# Altium footprint library mastermind.PCBLIB: 1061 footprints (part 5 of 67)
Each footprint in its own frame and in the unit in brackets; x right, y up, seen from the top. Pads: shape width x height; smd on the part's side, far side on the other; paste and mask are expansions set on the pad; w line width, h text height; cw(c..) or ccw(c..) is an arc to the next point about the centre after c.
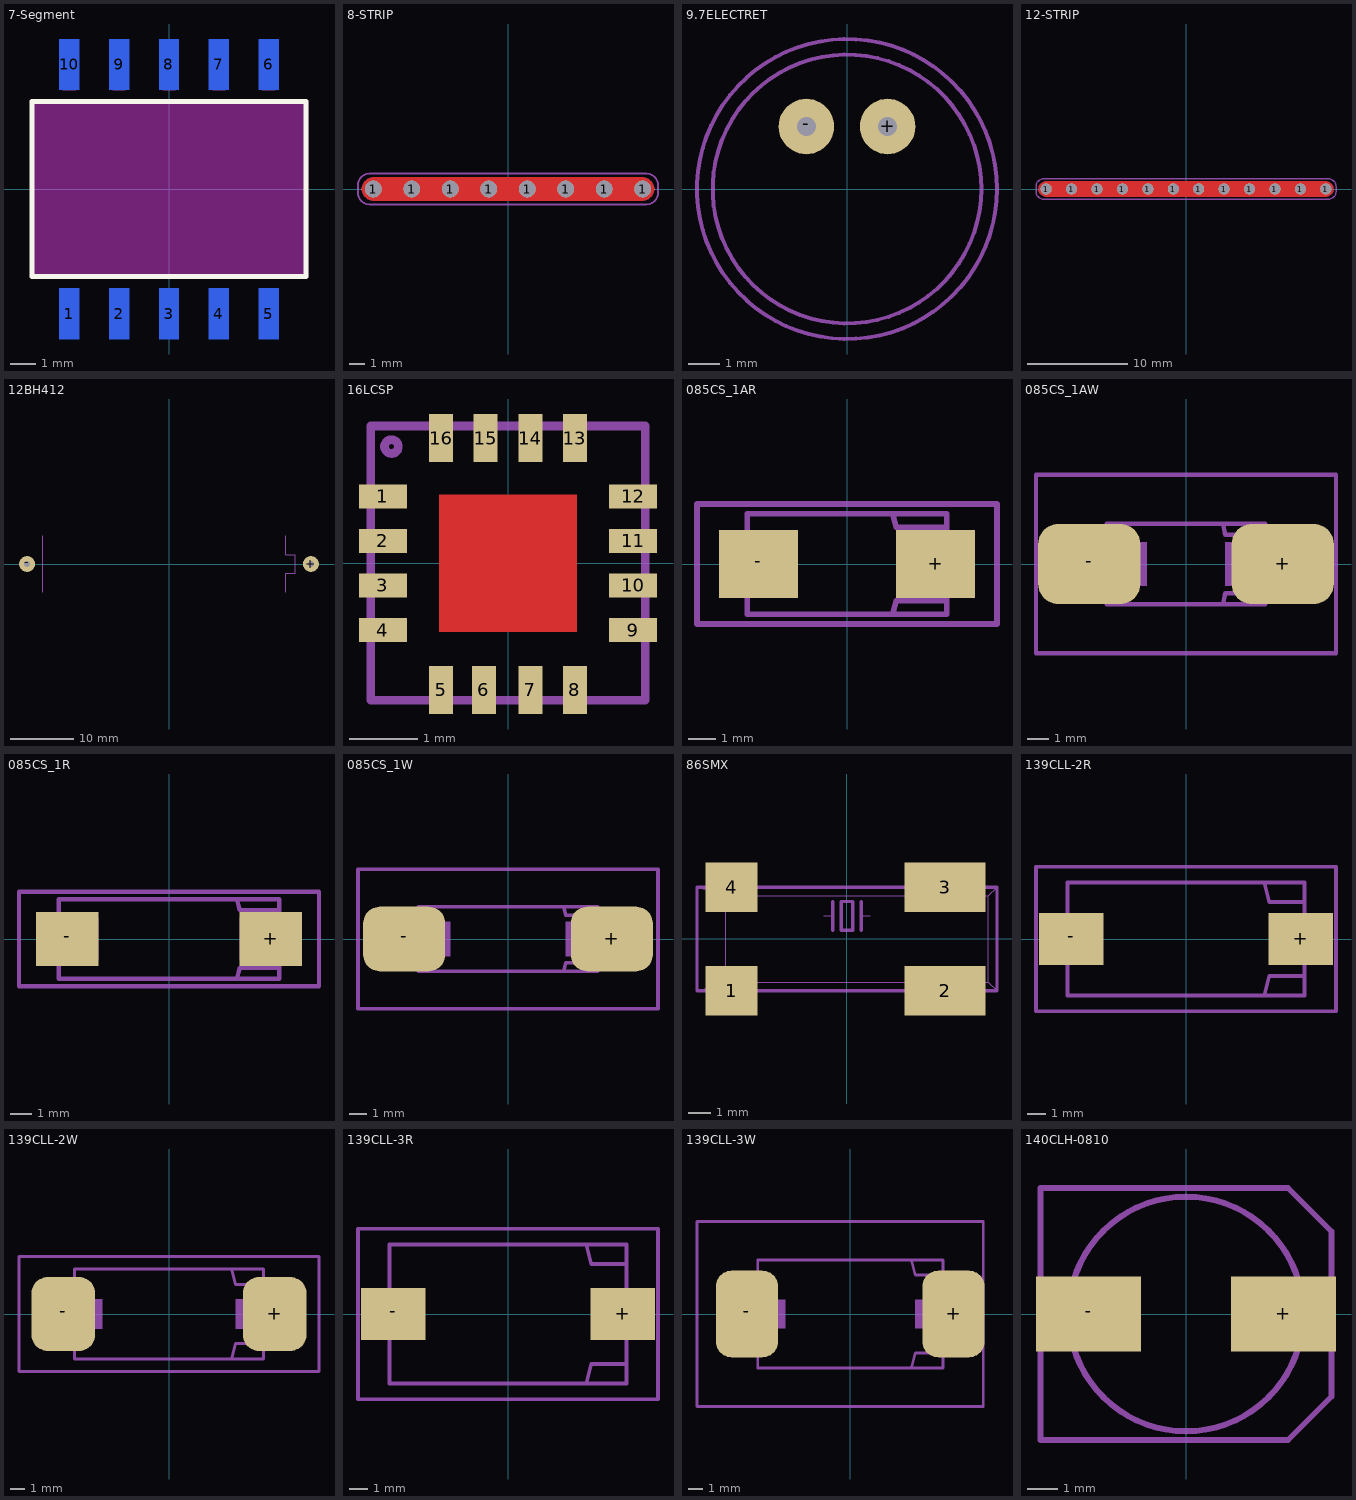
[diagram p4: the footprints below, top view; thin cyan lines are the x and y axes]

## 7-Segment [mm]
pads (10):
  rect 0.8x2.032 smd far side: 1(-4,-5) 2(-2,-5) 3(0,-5) 4(2,-5) 5(4,-5) 6(4,5) 7(2,5) 8(0,5) 9(-2,5) 10(-4,5)
Top Overlay:
  lines w0.2: -5.5,-3.5 5.5,-3.5 5.5,3.5 -5.5,3.5 -5.5,-3.5
Keep-Out Layer:
  region: -5.5,3.5 -5.5,-3.5 5.5,-3.5 5.5,3.5
  lines w0.2: -5.5,-3.5 5.5,-3.5 5.5,3.5 -5.5,3.5
Mechanical 8:
  region: -4.254,3.957 -4.254,5.1 -3.746,5.1 -3.746,3.957
  region: -2.254,3.957 -2.254,5.1 -1.746,5.1 -1.746,3.957
  region: 3.746,-5.127 3.746,-3.984 4.254,-3.984 4.254,-5.127
  region: -4.254,-5.127 -4.254,-3.984 -3.746,-3.984 -3.746,-5.127
  region: -2.254,-5.127 -2.254,-3.984 -1.746,-3.984 -1.746,-5.127
  region: 1.746,-5.127 1.746,-3.984 2.254,-3.984 2.254,-5.127
  region: -0.33,-5.129 -0.33,-3.986 0.178,-3.986 0.178,-5.129
  region: 3.746,3.957 3.746,5.1 4.254,5.1 4.254,3.957
  region: 1.746,3.957 1.746,5.1 2.254,5.1 2.254,3.957
  region: -0.254,3.957 -0.254,5.1 0.254,5.1 0.254,3.957

## 8-STRIP [mm]
pads (8):
  round 1.1 hole 1.1: 1(-8.89,0) 1(-6.35,0) 1(-3.81,0) 1(-1.27,0) 1(1.27,0) 1(3.81,0) 1(6.35,0) 1(8.89,0)
Top Layer:
  region: -9.652,0 -9.652,0.075 -9.623,0.222 -9.565,0.361 -9.482,0.486 -9.376,0.592 -9.251,0.675 -9.112,0.733 -8.965,0.762 -8.89,0.762 8.89,0.762 8.965,0.762 9.112,0.733 9.251,0.675 9.376,0.592 9.482,0.486 9.565,0.361 9.623,0.222 9.652,0.075 9.652,0 9.652,-0.075 9.623,-0.222 9.565,-0.361 9.482,-0.486 9.376,-0.592 9.251,-0.675 9.112,-0.733 8.965,-0.762 8.89,-0.762 -8.89,-0.762 -8.965,-0.762 -9.112,-0.733 -9.251,-0.675 -9.376,-0.592 -9.482,-0.486 -9.565,-0.361 -9.623,-0.222 -9.652,-0.075
Bottom Layer:
  region: 9.652,0 9.652,0.075 9.623,0.222 9.565,0.361 9.482,0.486 9.376,0.592 9.251,0.675 9.112,0.733 8.965,0.762 8.89,0.762 -8.89,0.762 -8.965,0.762 -9.112,0.733 -9.251,0.675 -9.376,0.592 -9.482,0.486 -9.565,0.361 -9.623,0.222 -9.652,0.075 -9.652,0 -9.652,-0.075 -9.623,-0.222 -9.565,-0.361 -9.482,-0.486 -9.376,-0.592 -9.251,-0.675 -9.112,-0.733 -8.965,-0.762 -8.89,-0.762 8.89,-0.762 8.965,-0.762 9.112,-0.733 9.251,-0.675 9.376,-0.592 9.482,-0.486 9.565,-0.361 9.623,-0.222 9.652,-0.075
Top Solder:
  region: -9.779,-0.127 -9.779,-0.202 -9.75,-0.349 -9.692,-0.488 -9.609,-0.613 -9.503,-0.719 -9.378,-0.802 -9.239,-0.86 -9.092,-0.889 -9.017,-0.889 9.017,-0.889 9.092,-0.889 9.239,-0.86 9.378,-0.802 9.503,-0.719 9.609,-0.613 9.692,-0.488 9.75,-0.349 9.779,-0.202 9.779,-0.127 9.779,0.127 9.779,0.202 9.75,0.349 9.692,0.488 9.609,0.613 9.503,0.719 9.378,0.802 9.239,0.86 9.092,0.889 9.017,0.889 -9.017,0.889 -9.092,0.889 -9.239,0.86 -9.378,0.802 -9.503,0.719 -9.609,0.613 -9.692,0.488 -9.75,0.349 -9.779,0.202 -9.779,0.127
Bottom Solder:
  region: 9.779,-0.127 9.779,-0.202 9.75,-0.349 9.692,-0.488 9.609,-0.613 9.503,-0.719 9.378,-0.802 9.239,-0.86 9.092,-0.889 9.017,-0.889 -9.017,-0.889 -9.092,-0.889 -9.239,-0.86 -9.378,-0.802 -9.503,-0.719 -9.609,-0.613 -9.692,-0.488 -9.75,-0.349 -9.779,-0.202 -9.779,-0.127 -9.779,0.127 -9.779,0.202 -9.75,0.349 -9.692,0.488 -9.609,0.613 -9.503,0.719 -9.378,0.802 -9.239,0.86 -9.092,0.889 -9.017,0.889 9.017,0.889 9.092,0.889 9.239,0.86 9.378,0.802 9.503,0.719 9.609,0.613 9.692,0.488 9.75,0.349 9.779,0.202 9.779,0.127
Mechanical 2:
  lines w0.127: -9.906,-0.254 ccw(c-9.144,-0.254) -9.144,-1.016 9.144,-1.016 ccw(c9.144,-0.254) 9.906,-0.254 9.906,0.254 ccw(c9.144,0.254) 9.144,1.016 -9.144,1.016 ccw(c-9.144,0.254) -9.906,0.254 -9.906,-0.254

## 9.7ELECTRET [mil]
pads (2):
  round 70 hole 23.62: +(51.18,78.74) -(-51.18,78.74)
Mechanical 2:
  circle w5: c0,0 r169.29
  circle w5: c0,0 r189.02

## 12-STRIP [mm]
pads (12):
  round 1.1 hole 1.1: 1(-13.97,0) 1(-11.43,0) 1(-8.89,0) 1(-6.35,0) 1(-3.81,0) 1(-1.27,0) 1(1.27,0) 1(3.81,0) 1(6.35,0) 1(8.89,0) 1(11.43,0) 1(13.97,0)
Top Layer:
  region: -14.732,0 -14.732,0.075 -14.703,0.222 -14.645,0.361 -14.562,0.486 -14.456,0.592 -14.331,0.675 -14.192,0.733 -14.045,0.762 -13.97,0.762 13.97,0.762 14.045,0.762 14.192,0.733 14.331,0.675 14.456,0.592 14.562,0.486 14.645,0.361 14.703,0.222 14.732,0.075 14.732,0 14.732,-0.075 14.703,-0.222 14.645,-0.361 14.562,-0.486 14.456,-0.592 14.331,-0.675 14.192,-0.733 14.045,-0.762 13.97,-0.762 -13.97,-0.762 -14.045,-0.762 -14.192,-0.733 -14.331,-0.675 -14.456,-0.592 -14.562,-0.486 -14.645,-0.361 -14.703,-0.222 -14.732,-0.075
Bottom Layer:
  region: 14.732,0 14.732,0.075 14.703,0.222 14.645,0.361 14.562,0.486 14.456,0.592 14.331,0.675 14.192,0.733 14.045,0.762 13.97,0.762 -13.97,0.762 -14.045,0.762 -14.192,0.733 -14.331,0.675 -14.456,0.592 -14.562,0.486 -14.645,0.361 -14.703,0.222 -14.732,0.075 -14.732,0 -14.732,-0.075 -14.703,-0.222 -14.645,-0.361 -14.562,-0.486 -14.456,-0.592 -14.331,-0.675 -14.192,-0.733 -14.045,-0.762 -13.97,-0.762 13.97,-0.762 14.045,-0.762 14.192,-0.733 14.331,-0.675 14.456,-0.592 14.562,-0.486 14.645,-0.361 14.703,-0.222 14.732,-0.075
Top Solder:
  region: -14.859,-0.127 -14.859,-0.202 -14.83,-0.349 -14.772,-0.488 -14.689,-0.613 -14.583,-0.719 -14.458,-0.802 -14.319,-0.86 -14.172,-0.889 -14.097,-0.889 14.097,-0.889 14.172,-0.889 14.319,-0.86 14.458,-0.802 14.583,-0.719 14.689,-0.613 14.772,-0.488 14.83,-0.349 14.859,-0.202 14.859,-0.127 14.859,0.127 14.859,0.202 14.83,0.349 14.772,0.488 14.689,0.613 14.583,0.719 14.458,0.802 14.319,0.86 14.172,0.889 14.097,0.889 -14.097,0.889 -14.172,0.889 -14.319,0.86 -14.458,0.802 -14.583,0.719 -14.689,0.613 -14.772,0.488 -14.83,0.349 -14.859,0.202 -14.859,0.127
Bottom Solder:
  region: 14.859,-0.127 14.859,-0.202 14.83,-0.349 14.772,-0.488 14.689,-0.613 14.583,-0.719 14.458,-0.802 14.319,-0.86 14.172,-0.889 14.097,-0.889 -14.097,-0.889 -14.172,-0.889 -14.319,-0.86 -14.458,-0.802 -14.583,-0.719 -14.689,-0.613 -14.772,-0.488 -14.83,-0.349 -14.859,-0.202 -14.859,-0.127 -14.859,0.127 -14.859,0.202 -14.83,0.349 -14.772,0.488 -14.689,0.613 -14.583,0.719 -14.458,0.802 -14.319,0.86 -14.172,0.889 -14.097,0.889 14.097,0.889 14.172,0.889 14.319,0.86 14.458,0.802 14.583,0.719 14.689,0.613 14.772,0.488 14.83,0.349 14.859,0.202 14.859,0.127
Mechanical 2:
  lines w0.127: -14.986,-0.254 ccw(c-14.224,-0.254) -14.224,-1.016 14.224,-1.016 ccw(c14.224,-0.254) 14.986,-0.254 14.986,0.254 ccw(c14.224,0.254) 14.224,1.016 -14.224,1.016 ccw(c-14.224,0.254) -14.986,0.254 -14.986,-0.254

## 12BH412 [mm]
pads (2):
  round 2.54 hole 1: +(22.5,0) -(-22.5,0)
Mechanical 2:
  lines w0.127: -20,-4.5 -20,4.5 ; 18.5,-4.5 18.5,-1.5 20,-1.5 20,1.5 18.5,1.5 18.5,4.5

## 16LCSP [mm]
pads (16):
  rect 0.7x0.35 smd: 1(-1.825,0.975) 2(-1.825,0.325) 3(-1.825,-0.325) 4(-1.825,-0.975) 9(1.825,-0.975) 10(1.825,-0.325) 11(1.825,0.325) 12(1.825,0.975)
  rect 0.35x0.7 smd: 5(-0.975,-1.85) 6(-0.35,-1.85) 7(0.325,-1.85) 8(0.975,-1.85) 13(0.975,1.825) 14(0.325,1.825) 15(-0.325,1.825) 16(-0.975,1.825)
Top Layer:
  region: -1,-1 -1,1 1,1 1,-1
Top Paste:
  region: -1,-1 -1,-0.3 -0.3,-0.3 -0.3,-1
  region: -1,0.3 -1,1 -0.3,1 -0.3,0.3
  region: 0.3,0.3 0.3,1 1,1 1,0.3
  region: 0.3,-1 0.3,-0.3 1,-0.3 1,-1
Top Solder:
  region: -1,-1 -1,1 1,1 1,-1
Mechanical 2:
  circle w0.127: c-1.7,1.7 r0.1
  lines w0.127: -2,-2 2,-2 2,2 -2,2 -2,-2

## 085CS_1AR [mm]
pads (2):
  rect 2.9x2.5 smd: +(3.25,0) -(-3.25,0)
Mechanical 2:
  lines w0.203: -3.65,-1.85 3.65,-1.85 ; -3.65,1.85 3.65,1.85 ; 1.7,-1.75 1.8,-1.35 ; 1.7,1.75 1.8,1.35
Mechanical 8:
  region: 1.8,-1 1.8,1 4.15,1 4.15,-1
  region: -4.15,-1 -4.15,1 -1.8,1 -1.8,-1
  lines w0.102: -4.45,-0.7 -4.45,0.7 -4.2,0.95 -4.2,-0.95 -4.45,-0.7 ; 4.2,-0.95 4.45,-0.7 4.45,0.7 4.2,0.95 4.2,-0.95
  lines w0.203: -4.3,-0.75 -4.3,0.75 ; -3.65,-1.85 -3.65,1.85 ; 1.8,-1.35 3.6,-1.35 ; 1.8,1.35 3.55,1.35 ; 3.65,-1.85 3.65,1.85 ; 4.3,-0.75 4.3,0.75
Mechanical 29 (Mech34):
  lines w0.203: -5.5,-2.2 -5.5,2.2 5.5,2.2 5.5,-2.2 -5.5,-2.2

## 085CS_1AW [mm]
pads (2):
  rrect50% 4.7x3.7 smd: +(4.45,0) -(-4.45,0)
Mechanical 2:
  lines w0.203: -3.65,-1.85 1.7,-1.85 1.8,-1.35 ; -3.65,1.85 1.7,1.85 1.8,1.35
Mechanical 8:
  region: 1.8,-1 1.8,1 4.15,1 4.15,-1
  region: -4.15,-1 -4.15,1 -1.8,1 -1.8,-1
  lines w0.102: -4.45,-0.7 -4.45,0.7 -4.2,0.95 -4.2,-0.95 -4.45,-0.7 ; 4.2,-0.95 4.45,-0.7 4.45,0.7 4.2,0.95 4.2,-0.95
  lines w0.203: -4.3,-0.75 -4.3,0.75 ; -3.65,-1.85 -3.65,1.85 ; 1.7,-1.85 3.65,-1.85 3.65,1.85 1.7,1.85 ; 1.8,-1.35 3.6,-1.35 ; 1.8,1.35 3.55,1.35 ; 4.3,-0.75 4.3,0.75
Mechanical 29 (Mech34):
  lines w0.203: -6.9,-4.1 -6.9,4.1 6.9,4.1 6.9,-4.1 -6.9,-4.1

## 085CS_1R [mm]
pads (2):
  rect 2.9x2.5 smd: +(4.75,0) -(-4.75,0)
Mechanical 2:
  lines w0.203: 3.2,-1.75 3.3,-1.35 ; 3.2,1.75 3.3,1.35 ; 5.15,-1.85 -5.15,-1.85 -5.15,1.85 5.15,1.85
Mechanical 8:
  region: 3.3,-1 3.3,1 5.65,1 5.65,-1
  region: -5.65,-1 -5.65,1 -3.3,1 -3.3,-1
  lines w0.102: -5.95,-0.7 -5.95,0.7 -5.7,0.95 -5.7,-0.95 -5.95,-0.7 ; 5.7,-0.95 5.95,-0.7 5.95,0.7 5.7,0.95 5.7,-0.95
  lines w0.203: -5.8,-0.75 -5.8,0.75 ; 3.3,-1.35 5.1,-1.35 ; 3.3,1.35 5.05,1.35 ; 5.15,-1.85 5.15,1.85 ; 5.8,-0.75 5.8,0.75
Mechanical 29 (Mech34):
  lines w0.203: -7,-2.2 -7,2.2 7,2.2 7,-2.2 -7,-2.2

## 085CS_1W [mm]
pads (2):
  rrect50% 4.7x3.7 smd: +(5.95,0) -(-5.95,0)
Mechanical 2:
  lines w0.203: -5.15,-1.85 3.2,-1.85 3.3,-1.35 ; -5.15,1.85 3.2,1.85 3.3,1.35
Mechanical 8:
  region: 3.3,-1 3.3,1 5.65,1 5.65,-1
  region: -5.65,-1 -5.65,1 -3.3,1 -3.3,-1
  lines w0.102: -5.95,-0.7 -5.95,0.7 -5.7,0.95 -5.7,-0.95 -5.95,-0.7 ; 5.7,-0.95 5.95,-0.7 5.95,0.7 5.7,0.95 5.7,-0.95
  lines w0.203: -5.8,-0.75 -5.8,0.75 ; -5.15,-1.85 -5.15,1.85 ; 3.2,-1.85 5.15,-1.85 5.15,1.85 3.2,1.85 ; 3.3,-1.35 5.1,-1.35 ; 3.3,1.35 5.05,1.35 ; 5.8,-0.75 5.8,0.75
Mechanical 29 (Mech34):
  lines w0.203: -8.6,-4 -8.6,4 8.6,4 8.6,-4 -8.6,-4

## 86SMX [mil]
pads (4):
  rect 90x86 smd: 1(-200,-90) 4(-200,90)
  rect 140x86 smd: 2(170,-90) 3(170,90)
Mechanical 2:
  lines w2: -260,-90 -250,-87 ; -260,90 -250,87 ; -210,-40 -210,40 ; -150,-75 95,-75 ; -150,75 95,75 ; -40,40 -25,40 ; 25,40 40,40 ; 260,-90 245,-75 245,75 260,90
  lines w6: -250,-90 -260,-90 -260,90 -250,90 ; -150,-90 95,-90 ; -150,90 95,90 ; -25,15 -25,40 -25,65 ; 25,15 25,40 25,65 ; 245,-90 260,-90 260,90 245,90 ; -10,15 10,15 10,65 -10,65 -10,15
Mechanical 8:
  lines w2: -250,-87 -210,-75 ; -250,87 -210,75 ; -210,-40 -210,-75 ; -210,40 -210,75 ; -150,-75 -210,-75 ; -150,75 -210,75 ; 95,-75 245,-75 ; 95,75 245,75
  lines w6: -250,-90 -235,-90 ; -250,90 -235,90 ; -150,-90 -165,-90 ; -150,90 -165,90 ; 95,-90 245,-90 ; 95,90 245,90 ; 110,-90 110,-100 230,-100 230,-90 ; 110,90 110,100 230,100 230,90 ; -235,-90 -235,-100 -165,-100 -165,-90 ; -235,-90 -165,-90 ; -235,90 -235,100 -165,100 -165,90 ; -235,90 -165,90

## 139CLL-2R [mm]
pads (2):
  rect 3.5x2.8 smd: +(6.2,0) -(-6.2,0)
Mechanical 2:
  lines w0.203: -6.4,-1.6 -6.4,-3.05 6.4,-3.05 6.4,-1.6 ; -6.4,1.6 -6.4,3.05 6.4,3.05 6.4,1.6 ; 4.25,-2.95 4.5,-2 6.35,-2 ; 4.25,2.95 4.5,2 6.35,2
Mechanical 8:
  region: -6.85,-1 -6.85,1 -4.5,1 -4.5,-1
  region: 4.5,-1 4.5,1 6.85,1 6.85,-1
  lines w0.203: -6.4,-1.6 -6.4,1.6 ; 6.4,-1.6 6.4,1.6
  lines w0.254: -7.15,-0.6 -7.15,0.6 -6.9,0.85 -6.9,-0.85 -7.15,-0.6 ; 6.9,-0.85 6.9,0.85 7.15,0.6 7.15,-0.6 6.9,-0.85
Mechanical 29 (Mech34):
  lines w0.203: -8.1,-3.9 8.1,-3.9 8.1,3.9 -8.1,3.9 -8.1,-3.9

## 139CLL-2W [mm]
pads (2):
  rrect50% 4.3x5 smd: +(7.15,0) -(-7.15,0)
Mechanical 2:
  lines w0.203: -6.4,-3.05 6.4,-3.05 ; -6.4,3.05 6.4,3.05 ; 4.25,-2.95 4.5,-2 ; 4.25,2.95 4.5,2
Mechanical 8:
  region: -6.85,-1 -6.85,1 -4.5,1 -4.5,-1
  region: 4.5,-1 4.5,1 6.85,1 6.85,-1
  lines w0.203: -6.4,-3.05 -6.4,3.05 ; 4.5,-2 6.35,-2 ; 4.5,2 6.35,2 ; 6.4,-3.05 6.4,3.05
  lines w0.254: -7.15,-0.6 -7.15,0.6 -6.9,0.85 -6.9,-0.85 -7.15,-0.6 ; 6.9,-0.85 6.9,0.85 7.15,0.6 7.15,-0.6 6.9,-0.85
Mechanical 29 (Mech34):
  lines w0.203: -10.15,-3.9 10.15,-3.9 10.15,3.9 -10.15,3.9 -10.15,-3.9

## 139CLL-3R [mm]
pads (2):
  rect 3.5x2.8 smd: +(6.2,0) -(-6.2,0)
Mechanical 2:
  lines w0.203: -6.4,-1.6 -6.4,-3.75 6.4,-3.75 6.4,-1.6 ; -6.4,1.6 -6.4,3.75 6.4,3.75 6.4,1.6 ; 4.25,-3.65 4.5,-2.7 6.35,-2.7 ; 4.25,3.65 4.5,2.7 6.35,2.7
Mechanical 8:
  region: 4.5,-1 4.5,1 6.85,1 6.85,-1
  region: -6.85,-1 -6.85,1 -4.5,1 -4.5,-1
  lines w0.203: -6.4,-1.6 -6.4,1.6 ; 6.4,-1.6 6.4,1.6
  lines w0.254: -7.15,-0.6 -6.9,-0.85 -6.9,0.85 -7.15,0.6 -7.15,-0.6 ; 6.9,-0.85 7.15,-0.6 7.15,0.6 6.9,0.85 6.9,-0.85
Mechanical 29 (Mech34):
  lines w0.203: -8.1,-4.6 -8.1,4.6 8.1,4.6 8.1,-4.6 -8.1,-4.6

## 139CLL-3W [mm]
pads (2):
  rrect50% 4.3x6 smd: +(7.15,0) -(-7.15,0)
Mechanical 2:
  lines w0.203: -6.4,-1.6 -6.4,-3.75 6.4,-3.75 6.4,-1.6 ; -6.4,1.6 -6.4,3.75 6.4,3.75 6.4,1.6 ; 4.25,-3.65 4.5,-2.7 6.35,-2.7 ; 4.25,3.65 4.5,2.7 6.35,2.7
Mechanical 8:
  region: -6.85,-1 -6.85,1 -4.5,1 -4.5,-1
  region: 4.5,-1 4.5,1 6.85,1 6.85,-1
  lines w0.203: -6.4,-1.6 -6.4,1.6 ; 6.4,-1.6 6.4,1.6
  lines w0.254: -7.15,-0.6 -7.15,0.6 -6.9,0.85 -6.9,-0.85 -7.15,-0.6 ; 6.9,-0.85 6.9,0.85 7.15,0.6 7.15,-0.6 6.9,-0.85
Mechanical 29 (Mech34):
  lines w0.203: -10.6,-6.4 9.2,-6.4 9.2,6.4 -10.6,6.4 -10.6,-6.4

## 140CLH-0810 [mm]
pads (2):
  rect 3.5x2.5 smd: +(3.25,0) -(-3.25,0)
Mechanical 2:
  lines w0.203: -4.85,-1.45 -4.85,-4.2 3.4,-4.2 4.85,-2.75 4.85,-1.45 ; -4.85,1.45 -4.85,4.2 3.4,4.2 4.85,2.75 4.85,1.45 ; -3.65,-1.4 ccw(c0,0) 3.65,-1.4 ; -3.65,1.4 cw(c0,0) 3.65,1.4
Mechanical 8:
  lines w0.203: -4.85,-1.45 -4.85,1.45 ; -3.65,-1.4 cw(c0,0) -3.65,1.4 ; 3.65,-1.4 ccw(c0,0) 3.65,1.4 ; 4.85,-1.45 4.85,1.45